# Altium footprint library LHAC-4XDSP2XV7-VP5_0226_3.PcbLib: 96 footprints (part 10 of 12)
Each footprint in its own frame and in the unit in brackets; x right, y up, seen from the top. Pads: shape width x height; smd on the part's side, far side on the other; paste and mask are expansions set on the pad; w line width, h text height; cw(c..) or ccw(c..) is an arc to the next point about the centre after c.
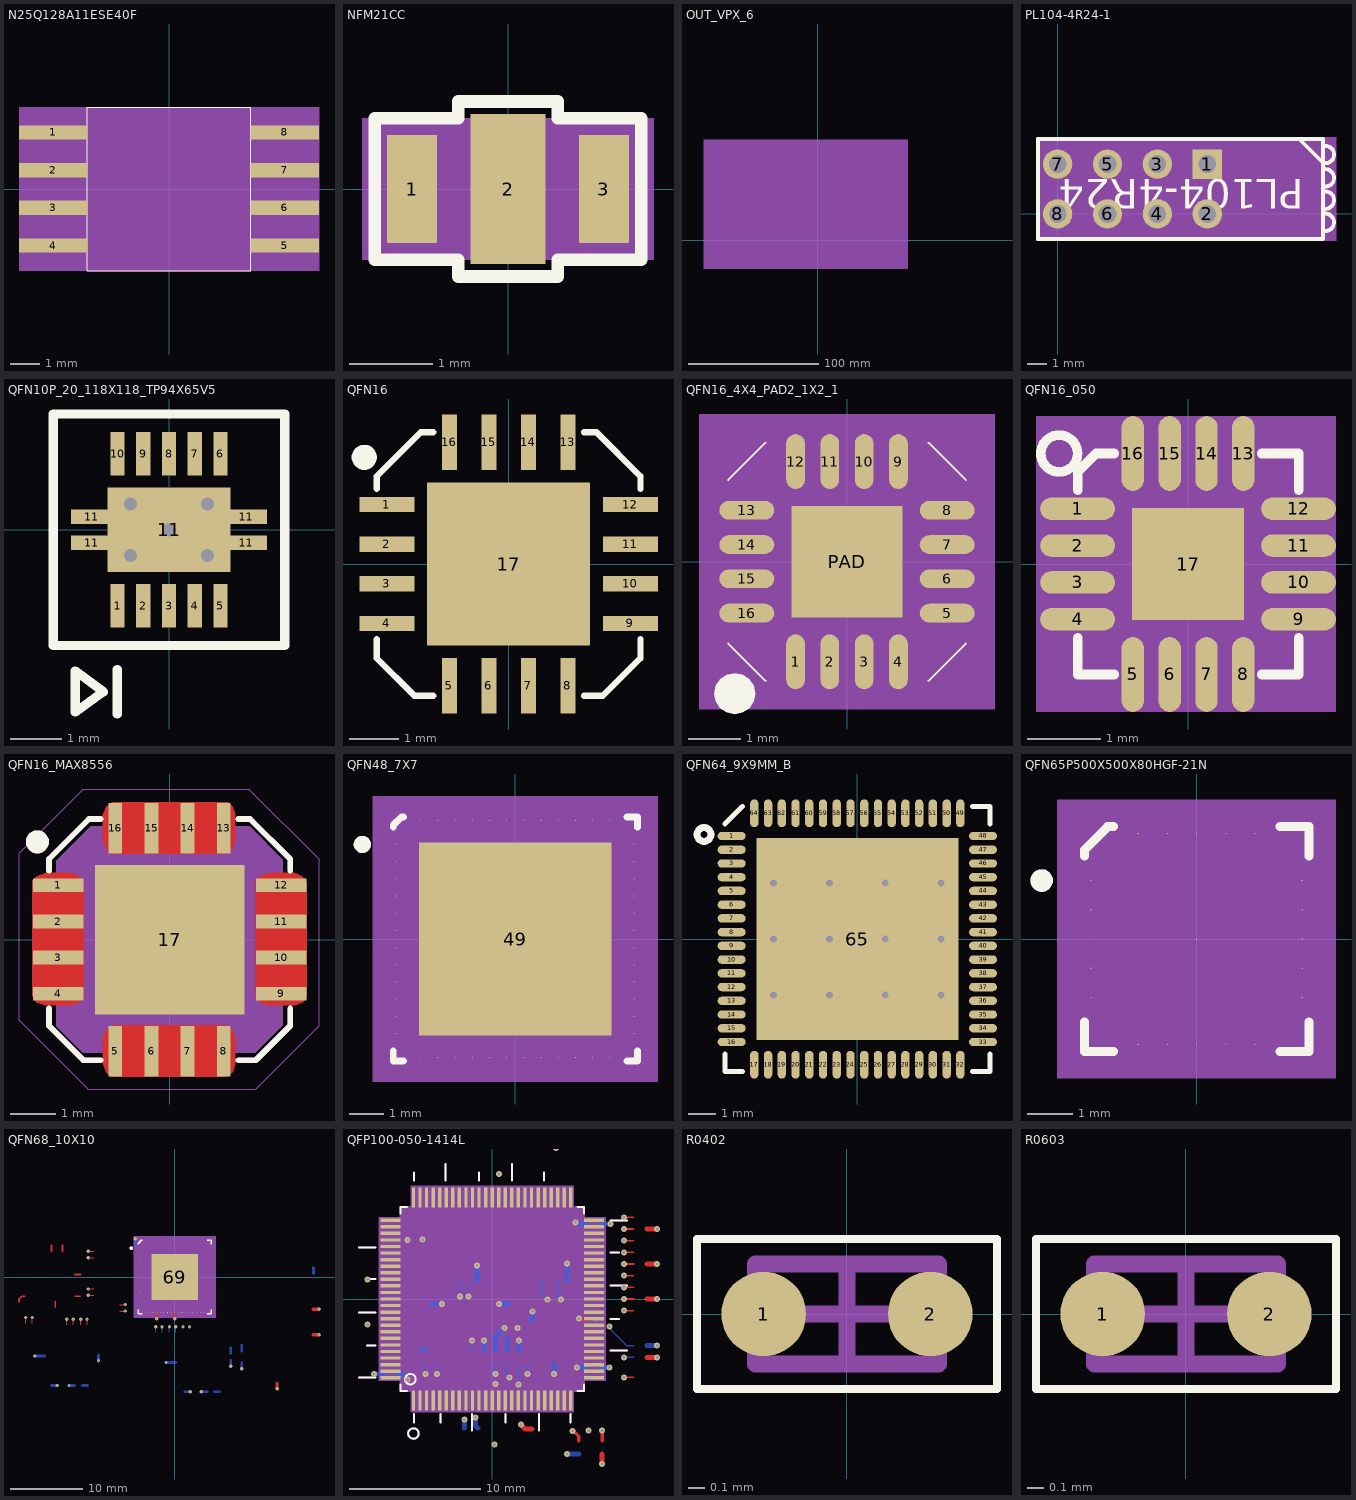
[diagram p9: the footprints below, top view; thin cyan lines are the x and y axes]

## N25Q128A11ESE40F [mil] "N25Q128A11ESE40F"
pads (8):
  rect 90.55x18.9 smd: 1(-153.54,75) 2(-153.54,25) 3(-153.54,-25) 4(-153.54,-75) 5(153.54,-75) 6(153.54,-25) 7(153.54,25) 8(153.54,75)
Top Overlay:
  lines w1: -108.27,-108.27 -108.27,108.27 108.27,108.27 108.27,-108.27 -108.27,-108.27
Mechanical 14:
  text "4" at -161.54,-75 h20
  text "1" at -161.54,75 h20
  text "3" at -161.54,-25 h20
  text "7" at 145.54,25 h20
  text "6" at 145.54,-25 h20
  text "2" at -161.54,25 h20
  text "5" at 145.54,-75 h20
  text "8" at 145.54,75 h20
Mechanical 16:
  region: -199.02,-108.27 -199.02,108.27 199.02,108.27 199.02,-108.27
  pour cut-out: -199.02,-108.27 -199.02,108.27 199.02,108.27 199.02,-108.27
  lines w1: -108.27,-108.27 -108.27,108.27 108.27,108.27 108.27,-108.27 -108.27,-108.27
Mechanical 20:
  text ".Designator" at -5.67,0 h5
3D body: height 150, standoff 0, extent -199.02,-108.27 199.02,108.27

## NFM21CC [mil] "NFM21CC"
pads (3):
  rect 23.62x51.18 smd: 1(-45.28,0) 3(45.28,0)
  rect 35.43x70.87 smd: 2(0,0)
Top Overlay:
  lines w5.91: -62.99,-33.46 -23.62,-33.46 -23.62,-41.34 23.62,-41.34 23.62,-33.46 62.99,-33.46 62.99,33.46 23.62,33.46 23.62,41.34 -23.62,41.34 -23.62,33.46 -62.99,33.46 -62.99,-33.46
Mechanical 14:
  text "2" at 0,-8 h10
  text "1" at -45.28,-8 h10
  text "3" at 45.28,-8 h10
Mechanical 16:
  region: -68.9,33.46 -68.9,-33.46 68.9,-33.46 68.9,33.46
Mechanical 20:
  text "NFM21PC225B0J3" at -19.69,60.24 h10
3D body: height 150, standoff 0, extent -68.9,-33.46 68.9,33.46

## OUT_VPX_6 [mil] "OUT_VPX_6"
pads (6):
  oct 1x1 smd: 1(5156.94,3968.86) 2(5436.94,1368.86) 3(5436.94,-731.14) 4(-3670.36,-731.14) 5(-3670.36,1368.86) 6(-3670.36,3968.86)
Top Overlay:
  text ".Designator" at 5107.89,3871.41 h25
Mechanical 5:
  text "U81" at 5107.89,3871.41 h25
Mechanical 14:
  text "3" at 5436.94,-715.14 h20
  text "2" at 5436.94,1384.86 h20
  text "1" at 5156.94,3984.86 h20
  text "4" at -3670.36,-715.14 h20
  text "6" at -3670.36,3984.86 h20
  text "5" at -3670.36,1384.86 h20
Mechanical 16:
  region: -3468.86,-870.36 2731.14,-870.36 2731.14,3046.94 -3468.86,3046.94
3D body: height 150, standoff 0, extent -3468.86,-870.36 2731.14,3046.94

## PL104-4R24-1 [mil] "PL104-4R24-1"
pads (8):
  rect 59.06x59.06 hole 35.43: 1(300,100)
  round 59.06 hole 35.43: 2(300,0) 3(200,100) 4(200,0) 5(100,100) 6(100,0) 7(0,100) 8(0,0)
Top Overlay:
  lines w7.87: 486.22,148.03 530.32,103.94 ; 536.22,-34.25 ccw(c536.46,-16.73) 536.22,0.79 ; 536.22,10.24 ccw(c536.47,27.76) 536.22,45.28 ; 536.22,54.72 ccw(c536.47,72.24) 536.22,89.76 ; 536.22,101.58 ccw(c536.47,119.1) 536.22,136.62 ; -39.37,-50 360.63,-50 532.28,-50 532.28,150 360.63,150 -39.37,150 -39.37,-50
  text "PL104-4R24" at 493.55,69.69 h59.06
  text ".Designator" at -60,75 h25
Mechanical 5:
  lines w7.87: 486.22,148.03 530.32,103.94 ; 536.22,-34.25 ccw(c536.46,-16.73) 536.22,0.79 ; 536.22,10.24 ccw(c536.47,27.76) 536.22,45.28 ; 536.22,54.72 ccw(c536.47,72.24) 536.22,89.76 ; 536.22,101.58 ccw(c536.47,119.1) 536.22,136.62 ; -39.37,-50 -39.37,150 360.63,150 532.28,150 532.28,-50 360.63,-50 -39.37,-50
  text "D6" at -59.99,75 h25
  text "PL104-4R24" at 493.55,69.69 h59.06
Mechanical 14:
  text "8" at 7.2,0 h17.99
  text "2" at 307.2,0 h17.99
  text "4" at 207.2,0 h17.99
  text "6" at 107.2,0 h17.99
  text "1" at 307.2,100 h17.99
  text "3" at 207.2,100 h17.99
  text "5" at 107.2,100 h17.99
  text "7" at 7.2,100 h17.99
Mechanical 16:
  region: -43.31,-53.94 557.93,-53.94 557.93,153.94 -43.31,153.94
Mechanical 17:
  text "PL104-4R24" at 63,-7.87 h15.75
  text "RichardLC" at 56.7,-7.87 h15.75
  text "pn" at 12.6,-7.87 h15.75
3D body: height 150, standoff 0, extent -43.31,-53.94 557.93,153.94

## QFN10P_20_118X118_TP94X65V5 [mm] "QFN10P_20_118X118_TP94X65V5"
pads (15):
  rect 0.279x0.85 smd: 1(-1,-1.475) 2(-0.5,-1.475) 3(0,-1.475) 4(0.5,-1.475) 5(1,-1.475) 6(1,1.475) 7(0.5,1.475) 8(0,1.475) 9(-0.5,1.475) 10(-1,1.475)
  rect 0.8x0.28 smd: 11(-1.5,-0.25) 11(-1.5,0.25) 11(1.5,-0.25) 11(1.5,0.25)
  rect 2.4x1.65 smd: 11(0,0)
via 0,0 diameter 0.457 hole 0.254
via -0.75,-0.5 diameter 0.457 hole 0.254
via -0.75,0.5 diameter 0.457 hole 0.254
via 0.75,0.5 diameter 0.457 hole 0.254
via 0.75,-0.5 diameter 0.457 hole 0.254
Top Overlay:
  lines w0.178: -1.007,-3.58 -1.007,-2.717 ; -2.25,-2.25 -2.25,2.25 2.25,2.25 2.25,-2.25 -2.25,-2.25 ; -1.821,-3.543 -1.821,-2.743 -1.275,-3.151 -1.821,-3.543
Mechanical 17:
  text ".Designator" at 0.152,0.042 h0.13

## QFN16 [mil] "QFN16"
pads (17):
  rect 44x12 smd: 1(-97,47.24) 2(-97,15.75) 3(-97,-15.75) 4(-97,-47.24) 9(97,-47.24) 10(97,-15.75) 11(97,15.75) 12(97,47.24)
  rect 12x44 smd: 5(-47.24,-97) 6(-15.75,-97) 7(15.75,-97) 8(47.24,-97) 13(47.24,97) 14(15.75,97) 15(-15.75,97) 16(-47.24,97)
  rect 130x130 smd: 17(0,0)
Top Overlay:
  circle w10: c-115,85 r5
  lines w5: -105,-60 -105,-75 -75,-105 -60,-105 ; -105,60 -105,70 -70,105 -60,105 ; 60,-105 75,-105 105,-75 105,-60 ; 60,105 70,105 105,70 105,60
Mechanical 17:
  text "MAX8556ETE+" at 13,-100 h20
  text ".Designator" at 6,-1.67 h5

## QFN16_4X4_PAD2_1X2_1 [mil] "QFN16_4X4_PAD2_1X2_1"
pads (17):
  oval 14x41 smd: 1(-38.39,-74.8) 2(-12.8,-74.8) 3(12.8,-74.8) 4(38.39,-74.8) 9(38.39,74.8) 10(12.8,74.8) 11(-12.8,74.8) 12(-38.39,74.8)
  oval 41x14 smd: 5(74.8,-38.39) 6(74.8,-12.8) 7(74.8,12.8) 8(74.8,38.39) 13(-74.8,38.39) 14(-74.8,12.8) 15(-74.8,-12.8) 16(-74.8,-38.39)
  rect 83x83 smd: PAD(0,0)
Top Overlay:
  pour cut-out: -83.86,-83.14 -89.71,-84.3 -94.67,-87.62 -97.99,-92.58 -99.15,-98.43 -97.99,-104.28 -94.67,-109.24 -89.71,-112.56 -83.86,-113.72 -78.01,-112.56 -73.05,-109.24 -69.73,-104.28 -68.57,-98.43 -69.73,-92.58 -73.05,-87.62 -78.01,-84.3
  lines w1: -88.74,-60.39 -88.74,-61.18 -61.18,-88.74 -60.39,-88.74 ; -88.74,60.39 -88.74,61.18 -61.18,88.74 -60.39,88.74 ; 60.39,-88.74 61.18,-88.74 88.74,-61.18 88.74,-60.39 ; 60.39,88.74 61.18,88.74 88.74,61.18 88.74,60.39
  text ".Designator" at -117.5,-35.99 h25
Mechanical 5:
  lines w1: -88.74,-60.39 -88.74,-61.18 -61.18,-88.74 -60.39,-88.74 ; -88.74,60.39 -88.74,61.18 -61.18,88.74 -60.39,88.74 ; 60.39,-88.74 61.18,-88.74 88.74,-61.18 88.74,-60.39 ; 60.39,88.74 61.18,88.74 88.74,61.18 88.74,60.39
  text "U132" at -117.5,-35.99 h25
Mechanical 14:
  text "8" at 74.8,18.39 h25
  text "5" at 74.8,-58.39 h25
  text "7" at 74.8,-7.2 h25
  text "9" at 38.39,54.8 h25
  text "4" at 38.39,-94.8 h25
  text "3" at 12.8,-94.8 h25
  text "2" at -12.8,-94.8 h25
  text "1" at -38.39,-94.8 h25
  text "16" at -74.8,-58.39 h25
  text "15" at -74.8,-32.8 h25
  text "12" at -38.39,34.8 h25
  text "11" at -12.8,34.8 h25
  text "10" at 12.8,34.8 h25
  text "14" at -74.8,-7.2 h25
  text "13" at -74.8,18.39 h25
  text "6" at 74.8,-32.8 h25
  text "PAD" at 0,-60 h25
Mechanical 16:
  pour cut-out: -105.3,-105.3 105.3,-105.3 105.3,105.3 -105.3,105.3
  pour cut-out: -39.37,-43.77 -45.22,-44.93 -50.18,-48.25 -53.5,-53.21 -54.66,-59.06 -53.5,-64.91 -50.18,-69.87 -45.22,-73.19 -39.37,-74.35 -33.52,-73.19 -28.56,-69.87 -25.24,-64.91 -24.08,-59.06 -25.24,-53.21 -28.56,-48.25 -33.52,-44.93
  region: -110.3,110.3 -110.3,-110.3 110.3,-110.3 110.3,110.3
  lines w1: -105.3,-105.3 -105.3,105.3 105.3,105.3 105.3,-105.3 -105.3,-105.3 ; -78.74,-55.12 -55.12,-78.74 55.12,-78.74 78.74,-55.12 78.74,55.12 55.12,78.74 -55.12,78.74 -78.74,55.12 -78.74,-55.12
Mechanical 17:
  text "ADP1741ACPZ-R7" at -11.35,-140 h25
  text "TOL" at 28.02,-30 h25
  text "UPN" at 67.39,-30 h25
Mechanical 31:
  text "REPLACE OB14X41_SM2X2.PAD WITH OB14X41_SM2X2_BUMP.PAD" at 0,-892.67 h25
  text "REPLACE 83X83_SM2X2.PAD WITH 83X83_SM2X2_BUMP.PAD" at 0,-892.04 h25
  text "TO CONVERT THIS NON-BUMPED FOOTPRINT SYMBOL TO A BUMPED VERSION;" at 0,-963.3 h25
  text "THE SIZE OF THE VIA BUMPS,QUANTITY AND THE LOCATION ON THE PADDLE PAD" at 0,-1131.41 h25
  text "IS TO BE DETERMINED BY THE RESPONSIBLE ENGINEER AND THE LAYOUT PERSON." at 0,-1180.78 h25
3D body: height 150, standoff 0, extent -110.3,-110.3 110.3,110.3

## QFN16_050 [mil] "QFN16_050"
pads (17):
  oval 40x12 smd: 1(-59.06,29.53) 2(-59.06,9.84) 3(-59.06,-9.84) 4(-59.06,-29.53) 9(59.06,-29.53) 10(59.06,-9.84) 11(59.06,9.84) 12(59.06,29.53)
  oval 12x40 smd: 5(-29.53,-59.06) 6(-9.84,-59.06) 7(9.84,-59.06) 8(29.53,-59.06) 13(29.53,59.06) 14(9.84,59.06) 15(-9.84,59.06) 16(-29.53,59.06)
  rect 60x60 smd: 17(0,0)
Top Overlay:
  lines w5.12: -59.06,-39.37 -59.06,-59.06 -39.37,-59.06 ; -59.06,39.37 -59.06,49.21 -49.21,59.06 -39.37,59.06 ; 39.37,-59.06 59.06,-59.06 59.06,-39.37 ; 39.37,59.06 59.06,59.06 59.06,39.37 ; -78.74,59.06 ccw(c-68.9,59.05) -68.9,49.21 ccw(c-68.9,59.05) -59.06,59.06 ccw(c-68.9,59.06) -68.9,68.9 ccw(c-68.9,59.06) -78.74,59.06
Mechanical 5:
  lines w5.12: -59.06,-39.37 -59.06,-59.06 -39.37,-59.06 ; -59.06,39.37 -59.06,49.21 -49.21,59.06 -39.37,59.06 ; 39.37,-59.06 59.06,-59.06 59.06,-39.37 ; 39.37,59.06 59.06,59.06 59.06,39.37 ; -78.74,59.06 cw(c-68.9,59.06) -68.9,68.9 cw(c-68.9,59.06) -59.06,59.06 cw(c-68.9,59.05) -68.9,49.21 cw(c-68.9,59.05) -78.74,59.06
  text "U120" at 58.72,-102.55 h25
Mechanical 14:
  text "10" at 75.06,-9.84 h10
  text "16" at -13.53,59.06 h10
  text "13" at 45.53,59.06 h10
  text "12" at 75.06,29.53 h10
  text "14" at 25.84,59.06 h10
  text "9" at 87.06,-29.53 h35
  text "17" at 56,0 h35
  text "6" at -1.84,-59.06 h10
  text "7" at 17.84,-59.06 h10
  text "8" at 37.53,-59.06 h10
  text "4" at -51.06,-29.53 h10
  text "11" at 75.06,9.84 h10
  text "2" at -51.06,9.84 h10
  text "1" at -51.06,29.53 h10
  text "3" at -51.06,-9.84 h10
  text "5" at -21.53,-59.06 h10
  text "15" at 6.16,59.06 h10
Mechanical 16:
  region: -81.3,-79.06 79.06,-79.06 79.06,79.06 -81.3,79.06
  lines w5.12: -59.06,-39.37 -59.06,-59.06 -39.37,-59.06 ; -59.06,39.37 -59.06,49.21 -49.21,59.06 -39.37,59.06 ; 39.37,-59.06 59.06,-59.06 59.06,-39.37 ; 39.37,59.06 59.06,59.06 59.06,39.37 ; -78.74,59.06 cw(c-68.9,59.06) -68.9,68.9 cw(c-68.9,59.06) -59.06,59.06 cw(c-68.9,59.05) -68.9,49.21 cw(c-68.9,59.05) -78.74,59.06
3D body: height 150, standoff 0, extent -81.3,-79.06 79.06,79.06

## QFN16_MAX8556 [mil] "QFN16_MAX8556"
pads (17):
  rect 44x12 smd: 1(-97,47.2) 2(-97,15.7) 3(-97,-15.7) 4(-97,-47.2) 9(97,-47.2) 10(97,-15.7) 11(97,15.7) 12(97,47.2)
  rect 12x44 smd: 5(-47.2,-97) 6(-15.7,-97) 7(15.7,-97) 8(47.2,-97) 13(47.2,97) 14(15.7,97) 15(-15.7,97) 16(-47.2,97)
  rect 130x130 smd: 17(0,0)
Top Layer:
  region: -74.5,50 -74.5,-51 -78.5,-55 -84.5,-57 -108.5,-57 -115.5,-55 -119.5,-49 -119.5,51 -115.5,55 -107.5,58 -85.5,58 -78.5,55
  region: 119.5,50 119.5,-51 115.5,-55 109.5,-57 85.5,-57 78.5,-55 74.5,-49 74.5,51 78.5,55 86.5,58 108.5,58 115.5,55
  region: -50,-74.5 51,-74.5 55,-78.5 57,-84.5 57,-108.5 55,-115.5 49,-119.5 -51,-119.5 -55,-115.5 -58,-107.5 -58,-85.5 -55,-78.5
  region: -50,119.5 51,119.5 55,115.5 57,109.5 57,85.5 55,78.5 49,74.5 -51,74.5 -55,78.5 -58,86.5 -58,108.5 -55,115.5
Top Overlay:
  circle w10: c-115,85 r5
  lines w5: -105,-60 -105,-75 -75,-105 -60,-105 ; -105,60 -105,70 -70,105 -60,105 ; 60,-105 75,-105 105,-75 105,-60 ; 60,105 70,105 105,70 105,60
  text ".Designator" at -137.5,-22.5 h25
Mechanical 5:
  circle w10: c-115,85 r5
  lines w5: -105,-60 -105,-75 -75,-105 -60,-105 ; -105,60 -105,70 -70,105 -60,105 ; 60,-105 75,-105 105,-75 105,-60 ; 60,105 70,105 105,70 105,60
  text "U22" at -180.83,4.16 h25
  text "MAX8556_0_QFN16_MAX8556_MAX8556" at 75,-1073.7 h80
Mechanical 14:
  text "6" at -15.7,-111 h35
  text "5" at -47.2,-111 h35
  text "16" at -47.2,69 h35
  text "4" at -97,-61.2 h35
  text "3" at -97,-29.7 h35
  text "2" at -97,1.7 h35
  text "1" at -97,33.2 h35
  text "11" at 97,-12.3 h35
  text "10" at 97,-43.7 h35
  text "9" at 97,-61.2 h35
  text "7" at 15.7,-111 h35
  text "8" at 47.2,-111 h35
  text "12" at 97,19.2 h35
  text "13" at 47.2,69 h35
  text "14" at 15.7,69 h35
  text "15" at -15.7,69 h35
  text "17" at 0,-28 h35
Mechanical 16:
  region: 98.4,-74.6 74.6,-98.4 -75.6,-98.4 -98.4,-75.6 -98.4,68.6 -68.6,98.4 69.6,98.4 98.4,69.6
  lines w1: -131,-70 -71.5,-129.5 -71,-130 75,-130 130,-75 130,70 69,131 -65,131 -75,131 -131,75 -131,-70
Mechanical 17:
  text "MAX8556ETE+" at -75,-188 h20
3D body: height 150, standoff 0, extent -98.4,-98.4 98.4,98.4

## QFN48_7X7 [mil] "QFN48_7X7"
pads (49):
  oct 1x1 smd: 1(-135.83,108.27) 2(-135.83,88.58) 3(-135.83,68.9) 4(-135.83,49.21) 5(-135.83,29.53) 6(-135.83,9.84) 7(-135.83,-9.84) 8(-135.83,-29.53) 9(-135.83,-49.21) 10(-135.83,-68.9) 11(-135.83,-88.58) 12(-135.83,-108.27) 13(-108.27,-135.83) 14(-88.58,-135.83) 15(-68.9,-135.83) 16(-49.21,-135.83) 17(-29.53,-135.83) 18(-9.84,-135.83) 19(9.84,-135.83) 20(29.53,-135.83) 21(49.21,-135.83) 22(68.9,-135.83) 23(88.58,-135.83) 24(108.27,-135.83) 25(135.83,-108.27) 26(135.83,-88.58) 27(135.83,-68.9) 28(135.83,-49.21) 29(135.83,-29.53) 30(135.83,-9.84) 31(135.83,9.84) 32(135.83,29.53) 33(135.83,49.21) 34(135.83,68.9) 35(135.83,88.58) 36(135.83,108.27) 37(108.27,135.83) 38(88.58,135.83) 39(68.9,135.83) 40(49.21,135.83) 41(29.53,135.83) 42(9.84,135.83) 43(-9.84,135.83) 44(-29.53,135.83) 45(-49.21,135.83) 46(-68.9,135.83) 47(-88.58,135.83) 48(-108.27,135.83)
  rect 220.47x220.47 smd: 49(0,0)
Top Overlay:
  circle w9.84: c-175.2,108.27 r4.92
  lines w7.87: -139.76,-127.95 -139.76,-139.76 -127.95,-139.76 ; -139.76,127.95 -139.76,130.31 -130.31,139.76 -127.95,139.76 ; 127.95,-139.76 139.76,-139.76 139.76,-127.95 ; 127.95,139.76 139.76,139.76 139.76,127.95
  text ".Designator" at -3.83,170.05 h25
Top Paste:
  pour cut-out: 13.39,13.39 13.39,83.46 83.46,83.46 83.46,13.39
  pour cut-out: -83.46,13.39 -83.46,83.46 -13.39,83.46 -13.39,13.39
  pour cut-out: 13.39,-83.46 13.39,-13.39 83.46,-13.39 83.46,-83.46
  pour cut-out: -83.46,-83.46 -83.46,-13.39 -13.39,-13.39 -13.39,-83.46
Mechanical 5:
  circle w9.84: c-175.2,108.27 r4.92
  lines w7.87: -139.76,-127.95 -139.76,-139.76 -127.95,-139.76 ; -139.76,127.95 -139.76,130.31 -130.31,139.76 -127.95,139.76 ; 127.95,-139.76 139.76,-139.76 139.76,-127.95 ; 127.95,139.76 139.76,139.76 139.76,127.95
  text "U119" at 66.16,170.05 h25
  text "HMC7043LP7FE_0_QFN48_7X7_HMC704" at -620,29.53 h50
Mechanical 14:
  text "14" at -108.58,-135.83 h25
  text "24" at 88.27,-135.83 h25
  text "49" at -20,0 h25
  text "6" at -145.83,9.84 h25
  text "7" at -145.83,-9.84 h25
  text "26" at 115.83,-88.58 h25
  text "25" at 115.83,-108.27 h25
  text "28" at 115.83,-49.21 h25
  text "29" at 115.83,-29.53 h25
  text "5" at -145.83,29.53 h25
  text "34" at 115.83,68.9 h25
  text "32" at 115.83,29.53 h25
  text "31" at 115.83,9.84 h25
  text "21" at 29.21,-135.83 h25
  text "20" at 9.53,-135.83 h25
  text "46" at -88.9,135.83 h25
  text "47" at -108.58,135.83 h25
  text "44" at -49.53,135.83 h25
  text "45" at -69.21,135.83 h25
  text "10" at -155.83,-68.9 h25
  text "15" at -88.9,-135.83 h25
  text "42" at -10.16,135.83 h25
  text "23" at 68.58,-135.83 h25
  text "35" at 115.83,88.58 h25
  text "22" at 48.9,-135.83 h25
  text "38" at 68.58,135.83 h25
  text "43" at -29.84,135.83 h25
  text "9" at -145.83,-49.21 h25
  text "41" at 9.53,135.83 h25
  text "40" at 29.21,135.83 h25
  text "37" at 88.27,135.83 h25
  text "18" at -29.84,-135.83 h25
  text "36" at 115.83,108.27 h25
  text "11" at -155.83,-88.58 h25
  text "16" at -69.21,-135.83 h25
  text "4" at -145.83,49.21 h25
  text "17" at -49.53,-135.83 h25
  text "12" at -155.83,-108.27 h25
  text "33" at 115.83,49.21 h25
  text "8" at -145.83,-29.53 h25
  text "19" at -10.16,-135.83 h25
  text "13" at -128.27,-135.83 h25
  text "27" at 115.83,-68.9 h25
  text "30" at 115.83,-9.84 h25
  text "39" at 48.9,135.83 h25
  text "48" at -128.27,135.83 h25
  text "3" at -145.83,68.9 h25
  text "1" at -145.83,108.27 h25
  text "2" at -145.83,88.58 h25
Mechanical 16:
  circle w1.97: c0,0 r13.78
  circle w3.94: c-99.41,99.41 r19.69
  region: -163.39,-163.39 -163.39,163.39 163.39,163.39 163.39,-163.39
  pour cut-out: -163.39,-163.39 -163.39,163.39 163.39,163.39 163.39,-163.39
  lines w1.97: -19.69,0 19.69,0 ; 0,-19.69 0,19.69
  lines w3.94: -138.78,-138.78 138.78,-138.78 138.78,138.78 -138.78,138.78 -138.78,-138.78
3D body: height 150, standoff 0, extent -163.39,-163.39 163.39,163.39

## QFN64_9X9MM_B [mil] "QFN64_9X9MM_B"
pads (65):
  oval 40x12 smd: 1(-180.3,147.75) 2(-180.3,128.05) 3(-180.3,108.35) 4(-180.3,88.65) 5(-180.3,68.95) 6(-180.3,49.25) 7(-180.3,29.55) 8(-180.3,9.85) 9(-180.3,-9.85) 10(-180.3,-29.55) 11(-180.3,-49.25) 12(-180.3,-68.95) 13(-180.3,-88.65) 14(-180.3,-108.35) 15(-180.3,-128.05) 16(-180.3,-147.75) 33(180.3,-147.75) 34(180.3,-128.05) 35(180.3,-108.35) 36(180.3,-88.65) 37(180.3,-68.95) 38(180.3,-49.25) 39(180.3,-29.55) 40(180.3,-9.85) 41(180.3,9.85) 42(180.3,29.55) 43(180.3,49.25) 44(180.3,68.95) 45(180.3,88.65) 46(180.3,108.35) 47(180.3,128.05) 48(180.3,147.75)
  oval 12x40 smd: 17(-147.75,-180.3) 18(-128.05,-180.3) 19(-108.35,-180.3) 20(-88.65,-180.3) 21(-68.95,-180.3) 22(-49.25,-180.3) 23(-29.55,-180.3) 24(-9.85,-180.3) 25(9.85,-180.3) 26(29.55,-180.3) 27(49.25,-180.3) 28(68.95,-180.3) 29(88.65,-180.3) 30(108.35,-180.3) 31(128.05,-180.3) 32(147.75,-180.3) 49(147.75,180.3) 50(128.05,180.3) 51(108.35,180.3) 52(88.65,180.3) 53(68.95,180.3) 54(49.25,180.3) 55(29.55,180.3) 56(9.85,180.3) 57(-9.85,180.3) 58(-29.55,180.3) 59(-49.25,180.3) 60(-68.95,180.3) 61(-88.65,180.3) 62(-108.35,180.3) 63(-128.05,180.3) 64(-147.75,180.3)
  rect 290x290 smd: 65(0,0)
via 120,80 diameter 18 hole 10
via 120,0 diameter 18 hole 10
via 120,-80 diameter 18 hole 10
via 40,-80 diameter 18 hole 10
via -40,-80 diameter 18 hole 10
via -120,-80 diameter 18 hole 10
via -40,0 diameter 18 hole 10
via 40,0 diameter 18 hole 10
via 40,80 diameter 18 hole 10
via -40,80 diameter 18 hole 10
via -120,0 diameter 18 hole 10
via -120,80 diameter 18 hole 10
Top Overlay:
  lines w7: -190,-165 -190,-190 -165,-190 ; -190,165 -165,190 ; 165,-190 190,-190 190,-165 ; 165,190 190,190 190,165
  lines w10: -230,150 cw(c-220,150) -220,160 cw(c-220,150) -210,150 cw(c-220,150) -220,140 cw(c-220,150) -230,150
Top Paste:
  pour cut-out: 135,-135 75,-135 75,-75 135,-75
  pour cut-out: 65,-135 5,-135 5,-75 65,-75
  pour cut-out: 65,-65 5,-65 5,-5 65,-5
  pour cut-out: 135,-65 75,-65 75,-5 135,-5
  pour cut-out: 135,5 75,5 75,65 135,65
  pour cut-out: 65,5 5,5 5,65 65,65
  pour cut-out: 135,75 75,75 75,135 135,135
  pour cut-out: 65,75 5,75 5,135 65,135
  pour cut-out: -5,75 -65,75 -65,135 -5,135
  pour cut-out: -5,5 -65,5 -65,65 -5,65
  pour cut-out: -5,-65 -65,-65 -65,-5 -5,-5
  pour cut-out: -5,-135 -65,-135 -65,-75 -5,-75
  pour cut-out: -75,75 -135,75 -135,135 -75,135
  pour cut-out: -75,5 -135,5 -135,65 -75,65
  pour cut-out: -75,-65 -135,-65 -135,-5 -75,-5
  pour cut-out: -75,-135 -135,-135 -135,-75 -75,-75
Mechanical 17:
  text ".Designator" at 60,-21.67 h50

## QFN65P500X500X80HGF-21N [mil] "QFN65P500X500X80HGF-21N"
pads (21):
  oct 1x1 smd: 1(-92.52,51.18) 2(-92.52,25.59) 3(-92.52,0) 4(-92.52,-25.59) 5(-92.52,-51.18) 6(-51.18,-92.52) 7(-25.59,-92.52) 8(0,-92.52) 9(25.59,-92.52) 10(51.18,-92.52) 11(92.52,-51.18) 12(92.52,-25.59) 13(92.52,0) 14(92.52,25.59) 15(92.52,51.18) 16(51.18,92.52) 17(25.59,92.52) 18(0,92.52) 19(-25.59,92.52) 20(-51.18,92.52) 21(0,0)
Top Overlay:
  circle w9.84: c-135.83,51.18 r4.92
  lines w7.87: -98.43,-72.83 -98.43,-98.43 -72.83,-98.43 ; -98.43,72.83 -98.43,77.95 -77.95,98.43 -72.83,98.43 ; 72.83,-98.43 98.43,-98.43 98.43,-72.83 ; 72.83,98.43 98.43,98.43 98.43,72.83
  text ".Designator" at 124.17,94.05 h25
Top Paste:
  pour cut-out: -39.84,39.84 39.85,39.84 39.85,-39.85 -39.84,-39.85
Mechanical 5:
  circle w9.84: c-135.83,51.18 r4.92
  lines w7.87: -98.43,-72.83 -98.43,-98.43 -72.83,-98.43 ; -98.43,72.83 -98.43,77.95 -77.95,98.43 -72.83,98.43 ; 72.83,-98.43 98.43,-98.43 98.43,-72.83 ; 72.83,98.43 98.43,98.43 98.43,72.83
  text "U129" at 124.16,94.05 h25
  text "TPS7A4700_2_QFN65P500X500X80HGF" at -310,29.53 h25
Mechanical 14:
  text "7" at -35.59,-92.52 h25
  text "21" at -20,0 h25
  text "16" at 31.18,92.52 h25
  text "15" at 72.52,51.18 h25
  text "13" at 72.52,0 h25
  text "10" at 31.18,-92.52 h25
  text "14" at 72.52,25.59 h25
  text "20" at -71.18,92.52 h25
  text "3" at -102.52,0 h25
  text "1" at -102.52,51.18 h25
  text "19" at -45.59,92.52 h25
  text "18" at -20,92.52 h25
  text "17" at 5.59,92.52 h25
  text "2" at -102.52,25.59 h25
  text "4" at -102.52,-25.59 h25
  text "5" at -102.52,-51.18 h25
  text "6" at -61.18,-92.52 h25
  text "8" at -10,-92.52 h25
  text "9" at 15.59,-92.52 h25
  text "11" at 72.52,-51.18 h25
  text "12" at 72.52,-25.59 h25
Mechanical 16:
  circle w1.97: c0,0 r13.78
  region: -122.05,-122.05 -122.05,122.05 122.05,122.05 122.05,-122.05
  pour cut-out: -122.05,-122.05 -122.05,122.05 122.05,122.05 122.05,-122.05
  lines w1.97: -19.69,0 19.69,0 ; 0,-19.69 0,19.69
  lines w3.94: -98.43,59.06 -59.06,98.43 ; -98.43,62.99 -62.99,98.43 ; -98.43,66.93 -66.93,98.43 ; -98.43,70.87 -70.87,98.43 ; -98.43,74.8 -74.8,98.43 ; -98.43,78.74 -78.74,98.43 ; -98.43,82.68 -82.68,98.43 ; -98.43,86.61 -86.61,98.43 ; -98.43,90.55 -90.55,98.43 ; -98.43,94.49 -94.49,98.43 ; -98.43,-98.43 98.43,-98.43 98.43,98.43 -98.43,98.43 -98.43,-98.43
3D body: height 150, standoff 0, extent -122.05,-122.05 122.05,122.05

## QFN68_10X10 [mil] "QFN68_10X10"
pads (69):
  oct 1x1 smd: 1(-192.91,157.48) 2(-192.91,137.8) 3(-192.91,118.11) 4(-192.91,98.43) 5(-192.91,78.74) 6(-192.91,59.06) 7(-192.91,39.37) 8(-192.91,19.69) 9(-192.91,0) 10(-192.91,-19.69) 11(-192.91,-39.37) 12(-192.91,-59.06) 13(-192.91,-78.74) 14(-192.91,-98.43) 15(-192.91,-118.11) 16(-192.91,-137.8) 17(-192.91,-157.48) 18(-157.48,-192.91) 19(-137.8,-192.91) 20(-118.11,-192.91) 21(-98.43,-192.91) 22(-78.74,-192.91) 23(-59.06,-192.91) 24(-39.37,-192.91) 25(-19.69,-192.91) 26(0,-192.91) 27(19.69,-192.91) 28(39.37,-192.91) 29(59.06,-192.91) 30(78.74,-192.91) 31(98.43,-192.91) 32(118.11,-192.91) 33(137.8,-192.91) 34(157.48,-192.91) 35(192.91,-157.48) 36(192.91,-137.8) 37(192.91,-118.11) 38(192.91,-98.43) 39(192.91,-78.74) 40(192.91,-59.06) 41(192.91,-39.37) 42(192.91,-19.69) 43(192.91,0) 44(192.91,19.69) 45(192.91,39.37) 46(192.91,59.06) 47(192.91,78.74) 48(192.91,98.43) 49(192.91,118.11) 50(192.91,137.8) 51(192.91,157.48) 52(157.48,192.91) 53(137.8,192.91) 54(118.11,192.91) 55(98.43,192.91) 56(78.74,192.91) 57(59.06,192.91) 58(39.37,192.91) 59(19.69,192.91) 60(0,192.91) 61(-19.69,192.91) 62(-39.37,192.91) 63(-59.06,192.91) 64(-78.74,192.91) 65(-98.43,192.91) 66(-118.11,192.91) 67(-137.8,192.91) 68(-157.48,192.91)
  rect 251.97x251.97 smd: 69(0,0)
via -762.45,-430 diameter 18 hole 10
via -640,-590 diameter 18 hole 10
via -575,-590 diameter 18 hole 10
via -215,208.5 diameter 18 hole 10
via -415,-455 diameter 18 hole 10
via -47.45,-465 diameter 18 hole 10
via 145,-625 diameter 18 hole 10
via 85,-625 diameter 18 hole 10
via 305,-485 diameter 18 hole 10
via 365,-498.5 diameter 18 hole 10
via 557,-608 diameter 18 hole 10
via 785,-315 diameter 18 hole 10
via 785,-175 diameter 18 hole 10
via 0,-227.6 diameter 18 hole 10
via -98.43,-227.6 diameter 18 hole 10
via -104,-270.5 diameter 18 hole 10
via 6,-270.5 diameter 18 hole 10
via -29,-270.5 diameter 18 hole 10
via -69,-270.5 diameter 18 hole 10
via -552,-230.5 diameter 18 hole 10
via -470,-100 diameter 18 hole 10
via -470,140 diameter 18 hole 10
via -470,105 diameter 18 hole 10
via -587,-230.5 diameter 18 hole 10
via -512,-230.5 diameter 18 hole 10
via -470,-65 diameter 18 hole 10
via -775,-220.5 diameter 18 hole 10
via -477,-230.5 diameter 18 hole 10
via -810,-220.5 diameter 18 hole 10
via -270,-150 diameter 18 hole 10
via -270,-185 diameter 18 hole 10
via 45,-270 diameter 18 hole 10
via 80,-270 diameter 18 hole 10
Top Layer:
  lines w4: -810,-250.5 -810,-220.5 ; -775,-250.5 -775,-220.5 ; -587,-260.5 -587,-230.5 ; -552,-260.5 -552,-230.5 ; -512,-260.5 -512,-230.5 ; -477,-260.5 -477,-230.5 ; -470,-100 -440,-100 ; -470,-65 -440,-65 ; -470,105 -440,105 ; -470,140 -440,140 ; -300,-185 -270,-185 ; -300,-150 -270,-150
  lines w10: -847.55,-134.84 -847.55,-119.83 -831.99,-104.27 -815.83,-104.27 ; -670.16,139.83 -670.16,171.56 ; -650.47,-163.56 -650.47,-131.83 ; -611.1,139.83 -611.1,171.56 ; -544.17,-104.27 -515.7,-104.27 ; -544.17,13.84 -512.44,13.84 ; -98.43,-227.6 -98.43,-192.91 ; 0,-227.6 0,-192.91
  lines w15: 557,-608 557,-578
  lines w20: 755,-315 785,-315 ; 755,-175 785,-175
Bottom Layer:
  lines w4: -104,-300.5 -104,-270.5 ; -69,-300.5 -69,-270.5 ; -29,-300.5 -29,-270.5 ; 6,-300.5 6,-270.5
  lines w15: -762.45,-430 -707.5,-430 ; -670,-590 -640,-590 ; -575,-590 -545,-590 ; -505,-590 -475,-590 ; -415,-455 -415,-425 ; -215,177.5 -215,208.5 ; -47.45,-465 7.5,-465 ; 55,-625 85,-625 ; 145,-625 175,-625 ; 215,-625 245,-625 ; 305,-485 305,-455 ; 305,-415 305,-385 ; 365,-498.5 365,-467.5 ; 365,-402.5 365,-371.5 ; 755,20 755,50
Top Overlay:
  circle w9.84: c-236.22,157.48 r4.92
  lines w7.87: -198.82,-177.17 -198.82,-198.82 -177.17,-198.82 ; -198.82,177.17 -198.82,181.5 -181.5,198.82 -177.17,198.82 ; 177.17,-198.82 198.82,-198.82 198.82,-177.17 ; 177.17,198.82 198.82,198.82 198.82,177.17
  text ".Designator" at -135.05,-314.83 h25
Top Paste:
  pour cut-out: 15.35,15.35 15.35,94.88 94.88,94.88 94.88,15.35
  pour cut-out: -94.88,15.35 -94.88,94.88 -15.35,94.88 -15.35,15.35
  pour cut-out: 15.35,-94.88 15.35,-15.35 94.88,-15.35 94.88,-94.88
  pour cut-out: -94.88,-94.88 -94.88,-15.35 -15.35,-15.35 -15.35,-94.88
Mechanical 5:
  circle w9.84: c-236.22,157.48 r4.92
  lines w7.87: -198.82,-177.17 -198.82,-198.82 -177.17,-198.82 ; -198.82,177.17 -198.82,181.5 -181.5,198.82 -177.17,198.82 ; 177.17,-198.82 198.82,-198.82 198.82,-177.17 ; 177.17,198.82 198.82,198.82 198.82,177.17
  text "U113" at -213.38,-358.18 h25
  text "HMC7044LP10BE_0_QFN68_10X10_HMC" at 0,-590.47 h50
Mechanical 14:
  text "69" at 0,-20 h25
  text "35" at 192.91,-177.48 h25
  text "36" at 192.91,-157.8 h25
  text "37" at 192.91,-138.11 h25
  text "56" at 78.74,172.91 h25
  text "57" at 59.06,172.91 h25
  text "68" at -157.48,172.91 h25
  text "17" at -192.91,-177.48 h25
  text "26" at 0,-212.91 h25
  text "41" at 192.91,-59.37 h25
  text "21" at -98.43,-212.91 h25
  text "38" at 192.91,-118.43 h25
  text "10" at -192.91,-39.69 h25
  text "51" at 192.91,137.48 h25
  text "8" at -192.91,9.69 h25
  text "66" at -118.11,172.91 h25
  text "50" at 192.91,117.8 h25
  text "44" at 192.91,-0.31 h25
  text "18" at -157.48,-212.91 h25
  text "19" at -137.8,-212.91 h25
  text "20" at -118.11,-212.91 h25
  text "6" at -192.91,49.06 h25
  text "62" at -39.37,172.91 h25
  text "63" at -59.06,172.91 h25
  text "52" at 157.48,172.91 h25
  text "31" at 98.43,-212.91 h25
  text "49" at 192.91,98.11 h25
  text "5" at -192.91,68.74 h25
  text "12" at -192.91,-79.06 h25
  text "11" at -192.91,-59.37 h25
  text "9" at -192.91,-10 h25
  text "64" at -78.74,172.91 h25
  text "46" at 192.91,39.06 h25
  text "7" at -192.91,29.37 h25
  text "55" at 98.43,172.91 h25
  text "45" at 192.91,19.37 h25
  text "65" at -98.43,172.91 h25
  text "32" at 118.11,-212.91 h25
  text "48" at 192.91,78.43 h25
  text "67" at -137.8,172.91 h25
  text "39" at 192.91,-98.74 h25
  text "40" at 192.91,-79.06 h25
  text "42" at 192.91,-39.69 h25
  text "43" at 192.91,-20 h25
  text "33" at 137.8,-212.91 h25
  text "34" at 157.48,-212.91 h25
  text "47" at 192.91,58.74 h25
  text "22" at -78.74,-212.91 h25
  text "25" at -19.69,-212.91 h25
  text "24" at -39.37,-212.91 h25
  text "1" at -192.91,147.48 h25
  text "3" at -192.91,108.11 h25
  text "23" at -59.06,-212.91 h25
  text "2" at -192.91,127.8 h25
  text "14" at -192.91,-118.43 h25
  text "13" at -192.91,-98.74 h25
  text "53" at 137.8,172.91 h25
  text "60" at 0,172.91 h25
  text "15" at -192.91,-138.11 h25
  text "16" at -192.91,-157.8 h25
  text "27" at 19.69,-212.91 h25
  text "28" at 39.37,-212.91 h25
  text "58" at 39.37,172.91 h25
  text "59" at 19.69,172.91 h25
  text "4" at -192.91,88.43 h25
  text "30" at 78.74,-212.91 h25
  text "29" at 59.06,-212.91 h25
  text "54" at 118.11,172.91 h25
  text "61" at -19.69,172.91 h25
Mechanical 16:
  circle w1.97: c0,0 r13.78
  circle w3.94: c-158.46,158.46 r19.69
  region: -222.44,-222.44 -222.44,222.44 222.44,222.44 222.44,-222.44
  pour cut-out: -222.44,-222.44 -222.44,222.44 222.44,222.44 222.44,-222.44
  lines w1.97: -19.69,0 19.69,0 ; 0,-19.69 0,19.69
  lines w3.94: -197.83,-197.83 197.83,-197.83 197.83,197.83 -197.83,197.83 -197.83,-197.83
3D body: height 150, standoff 0, extent -222.44,-222.44 222.44,222.44

## QFP100-050-1414L [mil] "QFP100-050-1414L"
pads (100):
  rect 10x60 smd: 1(-236.22,-305.12) 2(-216.54,-305.12) 3(-196.85,-305.12) 4(-177.17,-305.12) 5(-157.48,-305.12) 6(-137.8,-305.12) 7(-118.11,-305.12) 8(-98.43,-305.12) 9(-78.74,-305.12) 10(-59.06,-305.12) 11(-39.37,-305.12) 12(-19.69,-305.12) 13(0,-305.12) 14(19.69,-305.12) 15(39.37,-305.12) 16(59.06,-305.12) 17(78.74,-305.12) 18(98.43,-305.12) 19(118.11,-305.12) 20(137.8,-305.12) 21(157.48,-305.12) 22(177.17,-305.12) 23(196.85,-305.12) 24(216.54,-305.12) 25(236.22,-305.12) 51(236.22,305.12) 52(216.54,305.12) 53(196.85,305.12) 54(177.17,305.12) 55(157.48,305.12) 56(137.8,305.12) 57(118.11,305.12) 58(98.43,305.12) 59(78.74,305.12) 60(59.06,305.12) 61(39.37,305.12) 62(19.69,305.12) 63(0,305.12) 64(-19.69,305.12) 65(-39.37,305.12) 66(-59.06,305.12) 67(-78.74,305.12) 68(-98.43,305.12) 69(-118.11,305.12) 70(-137.8,305.12) 71(-157.48,305.12) 72(-177.17,305.12) 73(-196.85,305.12) 74(-216.54,305.12) 75(-236.22,305.12)
  rect 60x10 smd: 26(305.12,-236.22) 27(305.12,-216.54) 28(305.12,-196.85) 29(305.12,-177.17) 30(305.12,-157.48) 31(305.12,-137.8) 32(305.12,-118.11) 33(305.12,-98.43) 34(305.12,-78.74) 35(305.12,-59.06) 36(305.12,-39.37) 37(305.12,-19.69) 38(305.12,0) 39(305.12,19.69) 40(305.12,39.37) 41(305.12,59.06) 42(305.12,78.74) 43(305.12,98.43) 44(305.12,118.11) 45(305.12,137.8) 46(305.12,157.48) 47(305.12,177.17) 48(305.12,196.85) 49(305.12,216.54) 50(305.12,236.22) 76(-305.12,236.22) 77(-305.12,216.54) 78(-305.12,196.85) 79(-305.12,177.17) 80(-305.12,157.48) 81(-305.12,137.8) 82(-305.12,118.11) 83(-305.12,98.43) 84(-305.12,78.74) 85(-305.12,59.06) 86(-305.12,39.37) 87(-305.12,19.69) 88(-305.12,0) 89(-305.12,-19.69) 90(-305.12,-39.37) 91(-305.12,-59.06) 92(-305.12,-78.74) 93(-305.12,-98.43) 94(-305.12,-118.11) 95(-305.12,-137.8) 96(-305.12,-157.48) 97(-305.12,-177.17) 98(-305.12,-196.85) 99(-305.12,-216.54) 100(-305.12,-236.22)
via -150,-15 diameter 18 hole 10
via -253.55,-241.84 diameter 18 hole 10
via 121.45,-36.84 diameter 18 hole 10
via -25,-125 diameter 18 hole 10
via -45.43,100.51 diameter 18 hole 10
via -83.55,-361.84 diameter 18 hole 10
via 185,-225 diameter 18 hole 10
via 86.45,-376.84 diameter 18 hole 10
via 6.45,-436.84 diameter 18 hole 10
via 250,230 diameter 18 hole 10
via 495,-140 diameter 18 hole 10
via 255,-205 diameter 18 hole 10
via 224.57,107.06 diameter 18 hole 10
via 225,-465 diameter 18 hole 10
via 20,-15 diameter 18 hole 10
via 330,-495 diameter 18 hole 10
via 76.45,-86.84 diameter 18 hole 10
via 36.45,-86.84 diameter 18 hole 10
via -60,-125 diameter 18 hole 10
via -200,-225 diameter 18 hole 10
via 20,375 diameter 18 hole 10
via 80,-125 diameter 18 hole 10
via 495,-175 diameter 18 hole 10
via 191.45,453.16 diameter 18 hole 10
via -253.55,177.17 diameter 18 hole 10
via -208.55,178.16 diameter 18 hole 10
via 395,70 diameter 18 hole 10
via 395,245 diameter 18 hole 10
via 395,210 diameter 18 hole 10
via 395,175 diameter 18 hole 10
via 395,140 diameter 18 hole 10
via 395,105 diameter 18 hole 10
via 395,-35 diameter 18 hole 10
via 395,0 diameter 18 hole 10
via 395,35 diameter 18 hole 10
via -165,-225 diameter 18 hole 10
via 52,-235 diameter 18 hole 10
via -373.55,59.06 diameter 18 hole 10
via -373.55,-76.84 diameter 18 hole 10
via 241.65,-396.14 diameter 18 hole 10
via 351.45,-81.84 diameter 18 hole 10
via 105.95,-224.64 diameter 18 hole 10
via 330,-395 diameter 18 hole 10
via 289.65,-394.94 diameter 18 hole 10
via 206.45,-1.84 diameter 18 hole 10
via -96.61,7.52 diameter 18 hole 10
via 78.74,-256 diameter 18 hole 10
via -50,-355 diameter 18 hole 10
via -355,-225 diameter 18 hole 10
via 495,105 diameter 18 hole 10
via 495,210 diameter 18 hole 10
via 495,0 diameter 18 hole 10
via 355,225 diameter 18 hole 10
via 351.5,-205 diameter 18 hole 10
via 395,-235 diameter 18 hole 10
via -71.02,7.52 diameter 18 hole 10
via 395,-175 diameter 18 hole 10
via 10,-225 diameter 18 hole 10
via 166.45,-1.84 diameter 18 hole 10
via 260.12,-59.06 diameter 18 hole 10
via 10,-255 diameter 18 hole 10
Top Layer:
  lines w5: -305.12,-59.06 -267.62,-59.06 ; 395,-235 425,-235 ; 395,-35 425,-35 ; 395,0 425,0 ; 395,35 425,35 ; 395,70 425,70 ; 395,105 425,105 ; 395,140 425,140 ; 395,175 425,175 ; 395,210 425,210 ; 395,245 425,245
  lines w10: 241.65,-396.14 244.85,-396.14 260,-411.29 260,-425 ; 260.12,-59.06 305.12,-59.06 ; 330,-425 330,-395
  lines w15: 86.45,-376.84 99.61,-390 120,-390 ; 330,-495 330,-465 ; 465,-175 495,-175 ; 465,0 495,0 ; 465,105 495,105 ; 465,210 495,210
Bottom Layer:
  lines w4: -96.61,7.52 -96.61,54.02 ; -71.02,7.52 -71.02,54.02
  lines w5: -200,-225 -200,-195 ; -165,-225 -165,-195 ; -60,-155 -60,-125 ; 10,-225 10,-195 ; 45,-195 45,-228 52,-235 ; 78.74,-256 80,-254.74 80,-195 ; 105.95,-224.64 105.95,-204.05 115,-195 ; 147.8,54.02 147.8,16.81 166.45,-1.84 ; 198.98,54.02 198.98,5.63 206.45,-1.84 ; 351.45,-81.84 351.45,-86.84 404.61,-140 425,-140 ; 395,-175 425,-175
  lines w15: -355,-225 -325,-225 ; -285,-225 -270.39,-225 -253.55,-241.84 ; -208.39,-146.61 -200,-155 ; -180,-15 -150,-15 ; -83.55,-361.84 -83.55,-386.34 -83.05,-386.84 ; -50,-355 -50,-379.89 -43.05,-386.84 ; -45.43,54.02 -45.43,100.51 ; -25,-155 -25,-125 ; 10,-155 10,-113.29 36.45,-86.84 ; 20,-15 50,-15 ; 45,-155 45,-118.29 ; 80,-155 80,-125 ; 115,-65 121.45,-58.55 121.45,-36.84 ; 185,-225 185,-195 ; 224.57,54.02 224.57,107.06 ; 225,-465 260,-465 ; 250,230 255,225 285,225 ; 255,-205 285,-205 ; 325,-205 351.5,-205 ; 325,225 355,225 ; 465,-140 495,-140
Top Overlay:
  circle w6: c-236.22,-403.54 r15.75
  circle w6: c-245.59,-240.59 r15.8
  circle w6: c-245.59,-240.59 r15.8
  lines w6: -400,-235 -350,-235 ; -400,-40 -350,-40 ; -400,155 -350,155 ; -375,-140 -350,-140 ; -375,60 -350,60 ; -275.59,-255.91 -275.59,-275.59 -255.91,-275.59 ; -275.59,255.91 -275.59,275.59 -255.91,275.59 ; -235,-370 -235,-345 ; -235,355 -235,380 ; -155,-370 -155,-345 ; -140,355 -140,405 ; -60,-395 -60,-345 ; -40,355 -40,380 ; 40,-370 40,-345 ; 60,355 60,405 ; 140,-395 140,-345 ; 155,355 155,380 ; 235,-370 235,-345 ; 255.91,-275.59 275.59,-275.59 275.59,-255.91 ; 255.91,275.59 275.59,275.59 275.59,255.91 ; 355,-155 405,-155 ; 355,-60 380,-60 ; 355,40 405,40 ; 355,140 380,140 ; 355,235 405,235
Mechanical 5:
  circle w6: c-236.22,-403.54 r15.75
  lines w6: -400,-235 -350,-235 ; -400,-40 -350,-40 ; -400,155 -350,155 ; -375,-140 -350,-140 ; -375,60 -350,60 ; -275.59,-255.91 -275.59,-275.59 -255.91,-275.59 ; -275.59,255.91 -275.59,275.59 -255.91,275.59 ; -235,-370 -235,-345 ; -235,355 -235,362 ; -155,-370 -155,-345 ; -140,355 -140,405 ; -60,-395 -60,-345 ; -40,355 -40,380 ; 40,-370 40,-345 ; 60,355 60,405 ; 140,-395 140,-345 ; 155,355 155,380 ; 235,-370 235,-345 ; 255.91,-275.59 275.59,-275.59 275.59,-255.91 ; 255.91,275.59 275.59,275.59 275.59,255.91 ; 355,-155 405,-155 ; 355,-60 380,-60 ; 355,40 405,40 ; 355,140 380,140 ; 355,235 405,235 ; -261.39,-240.59 cw(c-245.59,-240.59) -245.59,-224.79 ; -261.39,-240.59 ccw(c-245.59,-240.59) -245.59,-256.39 ; -261.39,-240.59 cw(c-245.59,-240.59) -245.59,-224.79 ; -261.39,-240.59 ccw(c-245.59,-240.59) -245.59,-256.39 ; -245.59,-256.39 ccw(c-245.59,-240.59) -229.79,-240.59 ; -245.59,-256.39 ccw(c-245.59,-240.59) -229.79,-240.59 ; -245.59,-224.79 cw(c-245.59,-240.59) -229.79,-240.59 ; -245.59,-224.79 cw(c-245.59,-240.59) -229.79,-240.59
  text "U84" at -476.89,64.82 h25
  text "STM32F103VE_0_QFP100-050-1414L_" at -334.65,590.55 h25
Mechanical 14:
  text "74" at -216.54,241.12 h80
  text "99" at -305.12,-280.54 h80
  text "10" at -59.06,-369.12 h80
  text "19" at 118.11,-369.12 h80
  text "20" at 137.8,-369.12 h80
  text "49" at 305.12,152.54 h80
  text "27" at 305.12,-280.54 h80
  text "4" at -177.17,-337.12 h80
  text "83" at -305.12,34.43 h80
  text "84" at -305.12,14.74 h80
  text "82" at -305.12,54.11 h80
  text "79" at -305.12,113.17 h80
  text "78" at -305.12,132.85 h80
  text "41" at 305.12,-4.94 h80
  text "46" at 305.12,93.48 h80
  text "45" at 305.12,73.8 h80
  text "44" at 305.12,54.11 h80
  text "43" at 305.12,34.43 h80
  text "42" at 305.12,14.74 h80
  text "38" at 305.12,-64 h80
  text "39" at 305.12,-44.31 h80
  text "40" at 305.12,-24.63 h80
  text "5" at -157.48,-337.12 h80
  text "16" at 59.06,-369.12 h80
  text "85" at -305.12,-4.94 h80
  text "92" at -305.12,-142.74 h80
  text "93" at -305.12,-162.43 h80
  text "23" at 196.85,-369.12 h80
  text "34" at 305.12,-142.74 h80
  text "18" at 98.43,-369.12 h80
  text "22" at 177.17,-369.12 h80
  text "21" at 157.48,-369.12 h80
  text "25" at 236.22,-369.12 h80
  text "24" at 216.54,-369.12 h80
  text "31" at 305.12,-201.8 h80
  text "29" at 305.12,-241.17 h80
  text "13" at 0,-369.12 h80
  text "76" at -305.12,172.22 h80
  text "17" at 78.74,-369.12 h80
  text "75" at -236.22,241.12 h80
  text "11" at -39.37,-369.12 h80
  text "100" at -305.12,-332.22 h80
  text "50" at 305.12,172.22 h80
  text "28" at 305.12,-260.85 h80
  text "26" at 305.12,-300.22 h80
  text "94" at -305.12,-182.11 h80
  text "12" at -19.69,-369.12 h80
  text "30" at 305.12,-221.48 h80
  text "33" at 305.12,-162.43 h80
  text "72" at -177.17,241.12 h80
  text "15" at 39.37,-369.12 h80
  text "95" at -305.12,-201.8 h80
  text "32" at 305.12,-182.11 h80
  text "51" at 236.22,241.12 h80
  text "52" at 216.54,241.12 h80
  text "53" at 196.85,241.12 h80
  text "54" at 177.17,241.12 h80
  text "35" at 305.12,-123.06 h80
  text "14" at 19.69,-369.12 h80
  text "71" at -157.48,241.12 h80
  text "36" at 305.12,-103.37 h80
  text "37" at 305.12,-83.69 h80
  text "6" at -137.8,-337.12 h80
  text "3" at -196.85,-337.12 h80
  text "2" at -216.54,-337.12 h80
  text "1" at -236.22,-337.12 h80
  text "98" at -305.12,-260.85 h80
  text "97" at -305.12,-241.17 h80
  text "55" at 157.48,241.12 h80
  text "88" at -305.12,-64 h80
  text "87" at -305.12,-44.31 h80
  text "86" at -305.12,-24.63 h80
  text "81" at -305.12,73.8 h80
  text "66" at -59.06,241.12 h80
  text "65" at -39.37,241.12 h80
  text "64" at -19.69,241.12 h80
  text "63" at 0,241.12 h80
  text "9" at -78.74,-337.12 h80
  text "8" at -98.43,-337.12 h80
  text "80" at -305.12,93.48 h80
  text "70" at -137.8,241.12 h80
  text "73" at -196.85,241.12 h80
  text "59" at 78.74,241.12 h80
  text "67" at -78.74,241.12 h80
  text "68" at -98.43,241.12 h80
  text "48" at 305.12,132.85 h80
  text "47" at 305.12,113.17 h80
  text "90" at -305.12,-103.37 h80
  text "91" at -305.12,-123.06 h80
  text "77" at -305.12,152.54 h80
  text "89" at -305.12,-83.69 h80
  text "96" at -305.12,-221.48 h80
  text "56" at 137.8,241.12 h80
  text "57" at 118.11,241.12 h80
  text "58" at 98.43,241.12 h80
  text "61" at 39.37,241.12 h80
  text "60" at 59.06,241.12 h80
  text "62" at 19.69,241.12 h80
  text "7" at -118.11,-337.12 h80
  text "69" at -118.11,241.12 h80
Mechanical 16:
  circle w6: c-245.59,-240.59 r15.8
  region: -245,-340 -245,-275.59 -275.59,-275.59 -275.59,-245 -340,-245 -340,245 -275.59,245 -275.59,275.59 -245,275.59 -245,340 245,340 245,275.59 275.59,275.59 275.59,245 340,245 340,-245 275.59,-245 275.59,-275.59 245,-275.59 245,-340
  lines w6: -275.59,-240.59 -240.59,-275.59 ; -275.59,-275.59 -275.59,275.59 275.59,275.59 275.59,-275.59 -275.59,-275.59
Mechanical 17:
  text ".Designator" at 95.5,16.67 h25
  text "STM32F103VE_0_QFP100-050-1414L_" at -334.65,511.81 h25
  text "QFP100-050-1414L" at -334.65,669.29 h25
3D body: height 150, standoff 0, extent -340,-340 340,340

## R0402 [mil] "R0402"
pads (2):
  round 20 smd: 1(-19.68,0) 2(19.68,0)
Top Overlay:
  lines w1.97: -35.43,-17.72 35.43,-17.72 35.43,17.72 -35.43,17.72 -35.43,-17.72
Mechanical 13:
  lines w3.94: -21.65,-11.81 -21.65,11.81 21.65,11.81 21.65,-11.81 -21.65,-11.81
Mechanical 15:
  lines w1.97: -35.43,-17.72 35.43,-17.72 35.43,17.72 -35.43,17.72 -35.43,-17.72
  lines w3.94: -9.84,0 9.84,0 ; 0,-9.84 0,9.84
3D body "R0402.STEP": height 13.78, standoff 0, extent -19.68,-9.84 19.69,9.85

## R0603 [mil] "R0603"
pads (2):
  round 20 smd: 1(-19.68,0) 2(19.68,0)
Top Overlay:
  lines w1.97: -35.43,-17.72 35.43,-17.72 35.43,17.72 -35.43,17.72 -35.43,-17.72
Mechanical 13:
  lines w3.94: -21.65,-11.81 -21.65,11.81 21.65,11.81 21.65,-11.81 -21.65,-11.81
Mechanical 15:
  lines w1.97: -35.43,-17.72 35.43,-17.72 35.43,17.72 -35.43,17.72 -35.43,-17.72
  lines w3.94: -9.84,0 9.84,0 ; 0,-9.84 0,9.84
Mechanical 20:
  text "1.21K/1%" at 59,148 h25
  text "RESISTOR_R0603_1.21K/1%" at -241,148 h25
  text "SR0603" at -66,209 h25
3D body "R0402.STEP": height 13.78, standoff 0, extent -19.68,-9.84 19.69,9.85